# Altium footprint library SRAD_SAC_PcbLib.PcbLib: 33 footprints (part 2 of 3)
Each footprint in its own frame and in the unit in brackets; x right, y up, seen from the top. Pads: shape width x height; smd on the part's side, far side on the other; paste and mask are expansions set on the pad; w line width, h text height; cw(c..) or ccw(c..) is an arc to the next point about the centre after c.
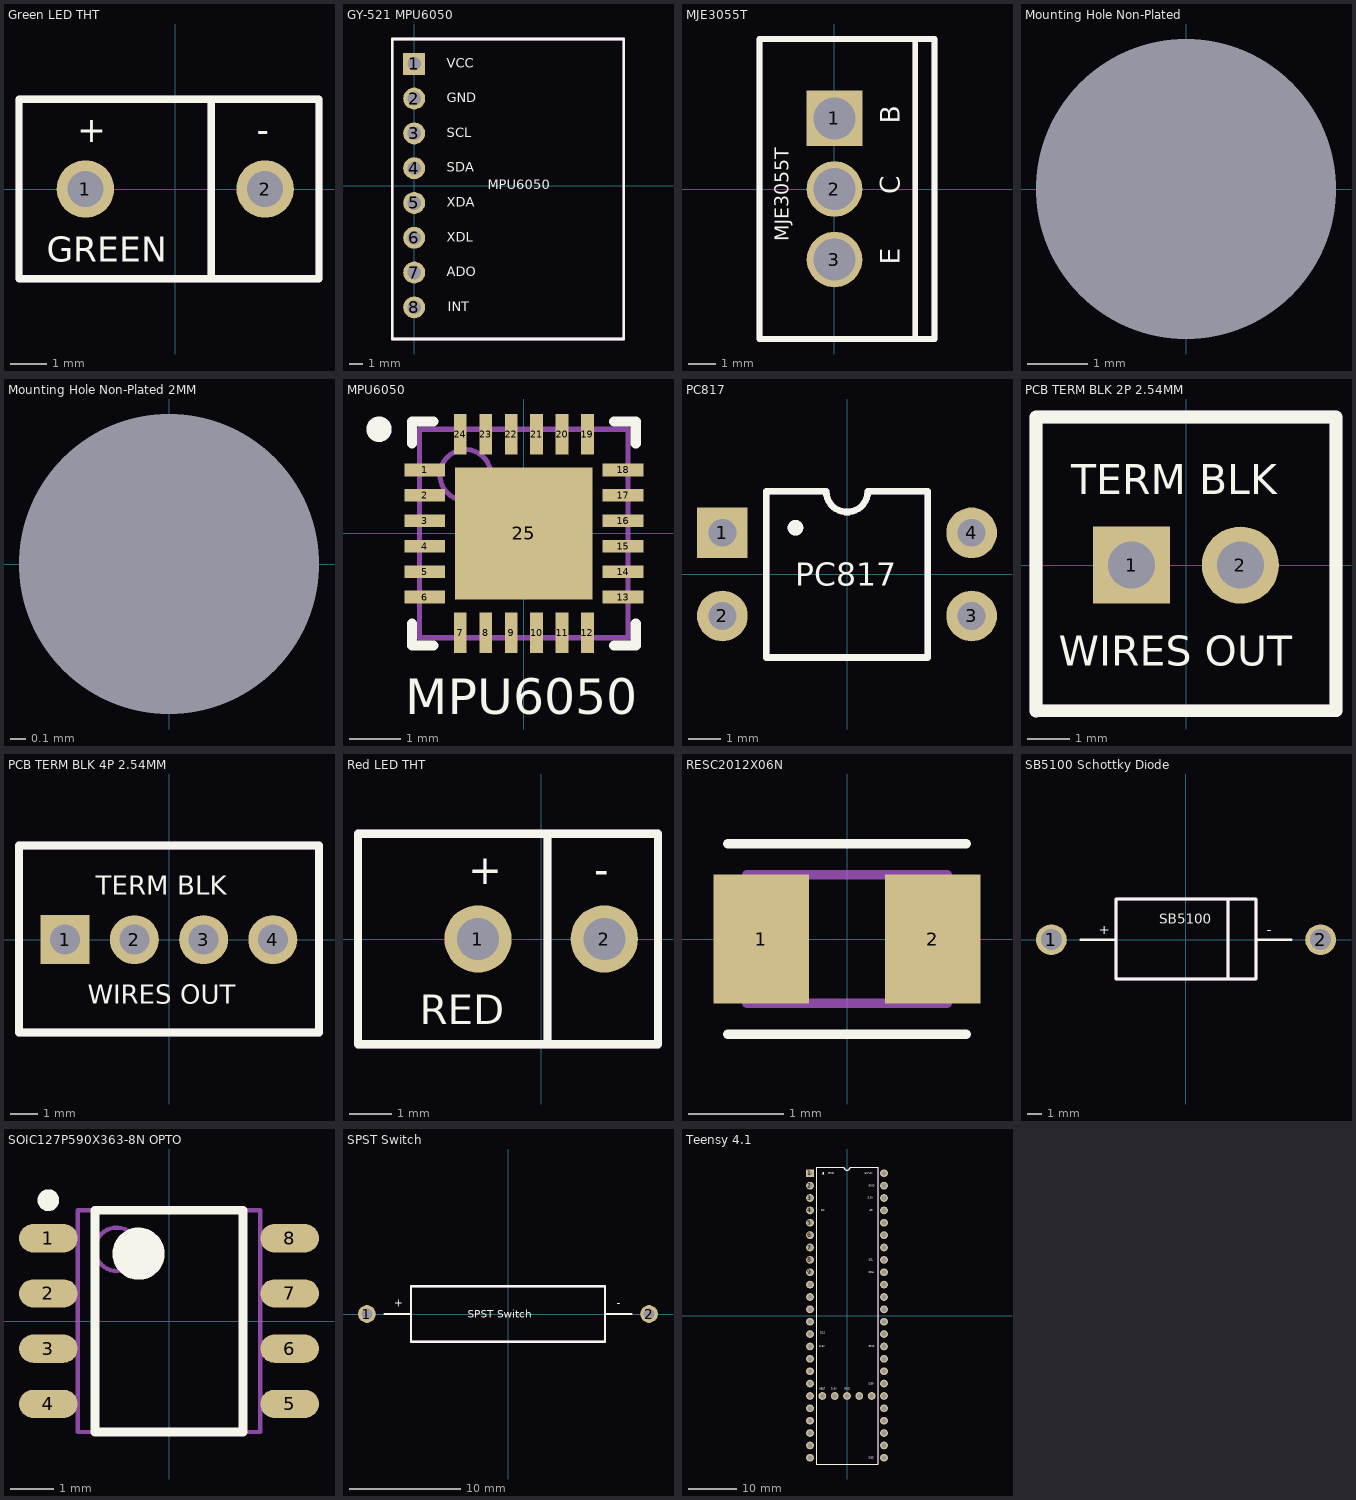
[diagram p1: the footprints below, top view; thin cyan lines are the x and y axes]

## Green LED THT [mm]
pads (2):
  round 1.6 hole 1: 1(-2.5,0) 2(2.5,0)
Top Overlay:
  lines w0.2: 1,-2.5 1,2.5 ; -4.35,-2.5 -4.35,2.5 4,2.5 4,-2.5 -4.35,-2.5
  text "GREEN" at -3.583,-2.025 h0.7
  text "+" at -2.733,1.3 h0.7
  text "-" at 2.267,1.3 h0.7
Top Assembly:
  lines w0.2: 1,-2.5 1,2.5 ; -4.35,-2.5 -4.35,2.5 4,2.5 4,-2.5 -4.35,-2.5
  text ".Designator" at -4.499,-0.233 h0.7
  text "GREEN" at -3.583,-2.025 h0.7
  text "+" at -2.733,1.3 h0.7
  text "-" at 2.267,1.3 h0.7
3D body "Green_LED_THT.stp": height 8.6, standoff -2.54, extent -3.163,-3.02 2.275,2.87

## GY-521 MPU6050 [mm] "Breakout board for MPU6050"
pads (8):
  rect 1.6x1.6 hole 1: 1(0,8.89)
  round 1.6 hole 1: 2(0,6.35) 3(0,3.81) 4(0,1.27) 5(0,-1.27) 6(0,-3.81) 7(0,-6.35) 8(0,-8.89)
Top Overlay:
  lines w0.2: -1.6,-11.2 -1.6,10.7 15.3,10.7 15.3,-11.2 -1.6,-11.2
  text "MPU6050" at 5.367,-0.275 h0.7
  text "VCC" at 2.392,8.615 h0.7
  text "GND" at 2.392,6.075 h0.7
  text "SCL" at 2.392,3.535 h0.7
  text "SDA" at 2.392,0.995 h0.7
  text "XDA" at 2.392,-1.545 h0.7
  text "XDL" at 2.392,-4.085 h0.7
  text "ADO" at 2.392,-6.625 h0.7
  text "INT" at 2.45,-9.165 h0.7
Top Assembly:
  lines w0.2: -1.6,-11.2 -1.6,10.7 15.3,10.7 15.3,-11.2 -1.6,-11.2
  text ".Designator" at 4.286,-0.233 h0.7
3D body "MPU6050_GY521.STEP": height 3.26, standoff -8.49, extent -1.375,-10.95 15.125,10.55

## MJE3055T [mm]
pads (3):
  rect 2x2 hole 1.5: 1(0,2.54)
  round 2 hole 1.5: 2(0,0) 3(0,-2.54)
Top Overlay:
  lines w0.2: 2.9,-5.4 2.9,5.4 ; -2.7,-5.4 -2.7,5.4 3.6,5.4 3.6,-5.4 -2.7,-5.4
  text "MJE3055T" at -1.65,-1.876 h0.5
  text "B" at 2.35,2.347 h0.7
  text "C" at 2.35,-0.193 h0.7
  text "E" at 2.35,-2.733 h0.7
Top Assembly:
  lines w0.2: 2.9,-5.4 2.9,5.4 ; -2.7,-5.4 -2.7,5.4 3.6,5.4 3.6,-5.4 -2.7,-5.4
  text ".Designator" at 0.233,-3.499 h0.7
3D body "MJE3055T.STEP": height 16.46, standoff -14.11, extent -2.642,-5.005 3.833,5.155

## Mounting Hole Non-Plated [mm]
pads (1):
  round 0 hole 5 unplated: "Mounting Hole Non-Plated"(0,0)

## Mounting Hole Non-Plated 2MM [mm]
pads (1):
  round 0 hole 2 unplated: "Mounting Hole Non-Plated"(0,0)

## MPU6050 [mm] "QFN, 24-Leads, Body 4.00x4.00mm, Pitch 0.50mm, Thermal Pad 2.70x2.60mm, IPC Medium Density"
height 0.95
pads (25):
  rect 0.8x0.25 smd mask+0.05: 1(-1.95,1.25) 2(-1.95,0.75) 3(-1.95,0.25) 4(-1.95,-0.25) 5(-1.95,-0.75) 6(-1.95,-1.25) 13(1.95,-1.25) 14(1.95,-0.75) 15(1.95,-0.25) 16(1.95,0.25) 17(1.95,0.75) 18(1.95,1.25)
  rect 0.25x0.8 smd mask+0.05: 7(-1.25,-1.95) 8(-0.75,-1.95) 9(-0.25,-1.95) 10(0.25,-1.95) 11(0.75,-1.95) 12(1.25,-1.95) 19(1.25,1.95) 20(0.75,1.95) 21(0.25,1.95) 22(-0.25,1.95) 23(-0.75,1.95) 24(-1.25,1.95)
  rect 2.7x2.6 smd mask+0.05: 25(0,0)
Top Overlay:
  circle w0.25: c-2.85,2.05 r0.125
  lines w0.2: -2.2,-1.775 -2.2,-2.2 -1.775,-2.2 ; -2.2,1.775 -2.2,2.2 -1.775,2.2 ; 1.775,-2.2 2.2,-2.2 2.2,-1.775 ; 1.775,2.2 2.2,2.2 2.2,1.775
  text "MPU6050" at -2.333,-3.55 h0.7
Top Assembly:
  circle w0.1: c-1.15,1.15 r0.5
  lines w0.1: -2.05,-2.05 2.05,-2.05 2.05,2.05 -2.05,2.05 -2.05,-2.05
  text ".Designator" at -3.499,-0.233 h0.7
3D body "QFN50P400X400X95_HS-25N.step": height 0.95, standoff 0, extent -2.051,-2.051 2.051,2.051

## PC817 [mm]
pads (4):
  rect 1.55x1.55 hole 0.85: 1(-3.81,1.27)
  round 1.55 hole 0.85: 2(-3.81,-1.27) 3(3.81,-1.27) 4(3.81,1.27)
Top Overlay:
  circle w0.254: c-1.575,1.425 r0.112
  lines w0.2: -2.475,-2.54 2.475,-2.54 2.475,2.54 0.635,2.54 cw(c0,2.54) -0.635,2.54 -2.475,2.54 -2.475,-2.54
  text "PC817" at -1.574,-0.35 h0.7
Top Assembly:
  circle w0.254: c-1.575,1.425 r0.112
  lines w0.2: -2.475,-2.54 2.475,-2.54 2.475,2.54 0.635,2.54 cw(c0,2.54) -0.635,2.54 -2.475,2.54 -2.475,-2.54
  text ".Designator" at -3.499,-0.233 h0.7
3D body "PC817_DIP4_Optocoupler.step": height 3.51, standoff -3.49, extent -3.965,-2.245 3.915,2.345

## PCB TERM BLK 2P 2.54MM [mm]
pads (2):
  rect 1.8x1.8 hole 1.1: 1(-1.27,0)
  round 1.8 hole 1.1: 2(1.27,0)
Top Overlay:
  lines w0.3: -3.5,-3.402 3.5,-3.4 3.5,3.45 -3.5,3.45 -3.5,-3.4
  text "TERM BLK" at -2.682,1.65 h0.7
  text "WIRES OUT" at -2.974,-2.35 h0.7
Top Assembly:
  lines w0.3: -3.5,-3.402 3.5,-3.4 3.5,3.45 -3.5,3.45 -3.5,-3.4
  text ".Designator" at -3.499,-0.233 h0.7
3D body "TE_Connectivity_2P_PC_Terminal_Block.stp": height 9.51, standoff -3.89, extent -2.74,-3.3 2.8,3.2

## PCB TERM BLK 4P 2.54MM [mm]
pads (4):
  rect 1.8x1.8 hole 1.1: 1(-3.81,0)
  round 1.8 hole 1.1: 2(-1.27,0) 3(1.27,0) 4(3.81,0)
Top Overlay:
  lines w0.3: -5.5,-3.4 5.5,-3.4 5.5,3.45 -5.5,3.45 -5.5,-3.4
  text "WIRES OUT" at -2.974,-2.35 h0.7
  text "TERM BLK" at -2.682,1.65 h0.7
Top Assembly:
  lines w0.3: -5.5,-3.4 -5.5,3.45 5.5,3.45 5.5,-3.4 -5.5,-3.4
  text ".Designator" at -3.499,-0.233 h0.7
3D body "TE_Connectivity_4P_PC_Terminal_Block.stp": height 9.51, standoff -3.89, extent -5.31,-3.225 5.31,3.275

## Red LED THT [mm]
pads (2):
  round 1.6 hole 1: 1(-1.5,0) 2(1.5,0)
Top Overlay:
  lines w0.2: 0.15,-2.5 0.15,2.5 ; -4.35,-2.5 -4.35,2.5 2.775,2.5 2.775,-2.5 -4.35,-2.5
  text "RED" at -2.883,-2.025 h0.7
  text "+" at -1.733,1.3 h0.7
  text "-" at 1.267,1.3 h0.7
Top Assembly:
  lines w0.2: 0.15,-2.5 0.15,2.5 ; -4.35,-2.5 -4.35,2.5 2.775,2.5 2.775,-2.5 -4.35,-2.5
  text ".Designator" at -4.499,-0.233 h0.7
3D body "Red_LED_THT.STEP": height 8.61, standoff -25.29, extent -2.943,-2.858 2.575,3.008

## RESC2012X06N [mm] "Chip Resistor, 2-Leads, Body 2.00x1.25mm, IPC Medium Density"
height 0.6
pads (2):
  rect 1x1.35 smd: 1(-0.9,0) 2(0.9,0)
Top Overlay:
  lines w0.1: -1.25,-1 1.25,-1 ; -1.25,1 1.25,1
Top Assembly:
  lines w0.1: -1.05,-0.675 -1.05,0.675 1.05,0.675 1.05,-0.675 -1.05,-0.675
  text ".Designator" at -3.499,-0.233 h0.7
3D body "RESC2012X06N.step": height 0.6, standoff 0, extent -1.05,-0.675 1.05,0.675

## SB5100 Schottky Diode [mm]
pads (2):
  round 2.2 hole 1.5: 1(-9.625,0) 2(9.625,0)
Top Overlay:
  lines w0.2: -7.5,0 -5,0 ; 3,-2.8 3,2.9 ; 5,0 7.5,0 ; -5,-2.8 5,-2.8 5,2.9 -5,2.9 -5,-2.8
  text "+" at -6.233,0.4 h0.7
  text "-" at 5.767,0.4 h0.7
  text "SB5100" at -1.924,1.15 h0.7
Top Assembly:
  lines w0.2: 3,-2.8 3,2.9 ; -5,-2.8 5,-2.8 5,2.9 -5,2.9 -5,-2.8
  text ".Designator" at -3.499,-0.233 h0.7
3D body "SB5100_Schottky_Diode_V02.step": height 2.64, standoff -20.4, extent -10.4,-2.622 10.4,2.672

## SOIC127P590X363-8N OPTO [mm] "SOIC, 8-Leads, Body 4.88x3.91mm, Pitch 1.27mm, IPC Medium Density"
height 3.63
pads (8):
  oval 1.35x0.65 smd: 1(-2.775,1.905) 2(-2.775,0.635) 3(-2.775,-0.635) 4(-2.775,-1.905) 5(2.775,-1.905) 6(2.775,-0.635) 7(2.775,0.635) 8(2.775,1.905)
Top Overlay:
  circle w0.25: c-2.775,2.78 r0.125
  circle w0.6: c-0.7,1.55 r0.3
  lines w0.2: -1.7,-2.55 -1.7,2.55 1.7,2.55 1.7,-2.55 -1.7,-2.55
Top Assembly:
  circle w0.1: c-1.2,1.65 r0.5
  lines w0.1: -2.1,-2.55 -2.1,2.55 2.1,2.55 2.1,-2.55 -2.1,-2.55
  text ".Designator" at -3.499,-0.233 h0.7
3D body "SOIC127P590X363-8N.step": height 3.63, standoff 0, extent -2.97,-2.55 2.97,2.55

## SPST Switch [mm]
pads (2):
  round 1.6 hole 1: 1(-12.7,0) 2(12.7,0)
Top Overlay:
  lines w0.2: -11.1,0 -8.725,0 ; 8.725,0 11.1,0 ; -8.725,0 -8.725,-2.5 8.725,-2.5 8.725,2.5 -8.725,2.5 -8.725,0
  text "SPST Switch" at -3.616,-0.35 h0.7
  text "+" at -10.233,0.65 h0.7
  text "-" at 9.767,0.65 h0.7
Top Assembly:
  lines w0.2: -11.1,0 -8.725,0 ; 8.725,0 11.1,0 ; -8.725,0 -8.725,-2.5 8.725,-2.5 8.725,2.5 -8.725,2.5 -8.725,0
  text ".Designator" at -3.499,-0.233 h0.7

## StrataloggerCF [mm]

## Teensy 4.1 [mm]
pads (53):
  rect 1.6x1.6 hole 1: 1(-7.6,29.21)
  round 1.6 hole 1: 2(-7.6,26.67) 3(-7.6,24.13) 4(-7.6,21.59) 5(-7.6,19.05) 6(-7.6,16.51) 7(-7.6,13.97) 8(-7.6,11.43) 9(-7.6,8.89) 10(-7.6,6.35) 11(-7.6,3.81) 12(-7.6,1.27) 13(-7.6,-1.27) 14(-7.6,-3.81) 15(-7.6,-6.35) 16(-7.6,-8.89) 17(-7.6,-11.43) 18(-7.6,-13.97) 19(-7.6,-16.51) 20(-7.6,-19.05) 21(-7.6,-21.59) 22(-7.6,-24.13) 23(-7.6,-26.67) 24(-7.6,-29.21) 25(7.6,-29.21) 26(7.6,-26.67) 27(7.6,-24.13) 28(7.6,-21.59) 29(7.6,-19.05) 30(7.6,-16.51) 31(7.6,-13.97) 32(7.6,-11.43) 33(7.6,-8.89) 34(7.6,-6.35) 35(7.6,-3.81) 36(7.6,-1.27) 37(7.6,1.27) 38(7.6,3.81) 39(7.6,6.35) 40(7.6,8.89) 41(7.6,11.43) 42(7.6,13.97) 43(7.6,16.51) 44(7.6,19.05) 45(7.6,21.59) 46(7.6,24.13) 47(7.6,26.67) 48(7.6,29.21) 49(-5.06,-16.51) 50(-2.53,-16.51) 51(0,-16.51) 52(2.53,-16.51) 53(5.06,-16.51)
Top Overlay:
  circle w0.254: c-4.85,29.21 r0.1
  lines w0.2: -6.3,-30.48 6.3,-30.48 6.3,30.48 0.635,30.48 cw(c0,30.48) -0.635,30.48 -6.3,30.48 -6.3,-30.48
  text "SDA" at 4.467,8.69 h0.4
  text "SCL" at 4.467,11.23 h0.4
  text "D39" at 4.467,-14.17 h0.4
  text "D33" at 4.467,-29.41 h0.4
  text "GND" at 4.467,-6.55 h0.4
  text "GND" at -3.876,29.01 h0.4
  text "3.3V" at 4.3,23.93 h0.4
  text "D2" at -5.333,21.39 h0.4
  text "GND" at -0.533,-15.2 h0.4
  text "VBAT" at -5.733,-15.2 h0.4
  text "5V/VIN" at 3.6,29.025 h0.4
  text "D12" at -5.5,-3.7 h0.4
  text "3.3V" at -3.2,-15.2 h0.4
  text "GND" at 4.467,26.47 h0.4
  text "3.3V" at -5.7,-6.55 h0.4
  text "A9" at 4.667,21.39 h0.4
Top Assembly:
  circle w0.254: c-4.85,29.21 r0.1
  lines w0.2: -6.3,-30.48 6.3,-30.48 6.3,30.48 0.635,30.48 cw(c0,30.48) -0.635,30.48 -6.3,30.48 -6.3,-30.48
  text ".Designator" at -3.499,-0.233 h0.7
3D body "Teensy_4.1.step": height 2.45, standoff -10.11, extent -9.09,-30.61 8.69,31.05